# Altium footprint library SAMTEC SMD.PcbLib: 165 footprints (part 2 of 17)
Each footprint in its own frame and in the unit in brackets; x right, y up, seen from the top. Pads: shape width x height; smd on the part's side, far side on the other; paste and mask are expansions set on the pad; w line width, h text height; cw(c..) or ccw(c..) is an arc to the next point about the centre after c.
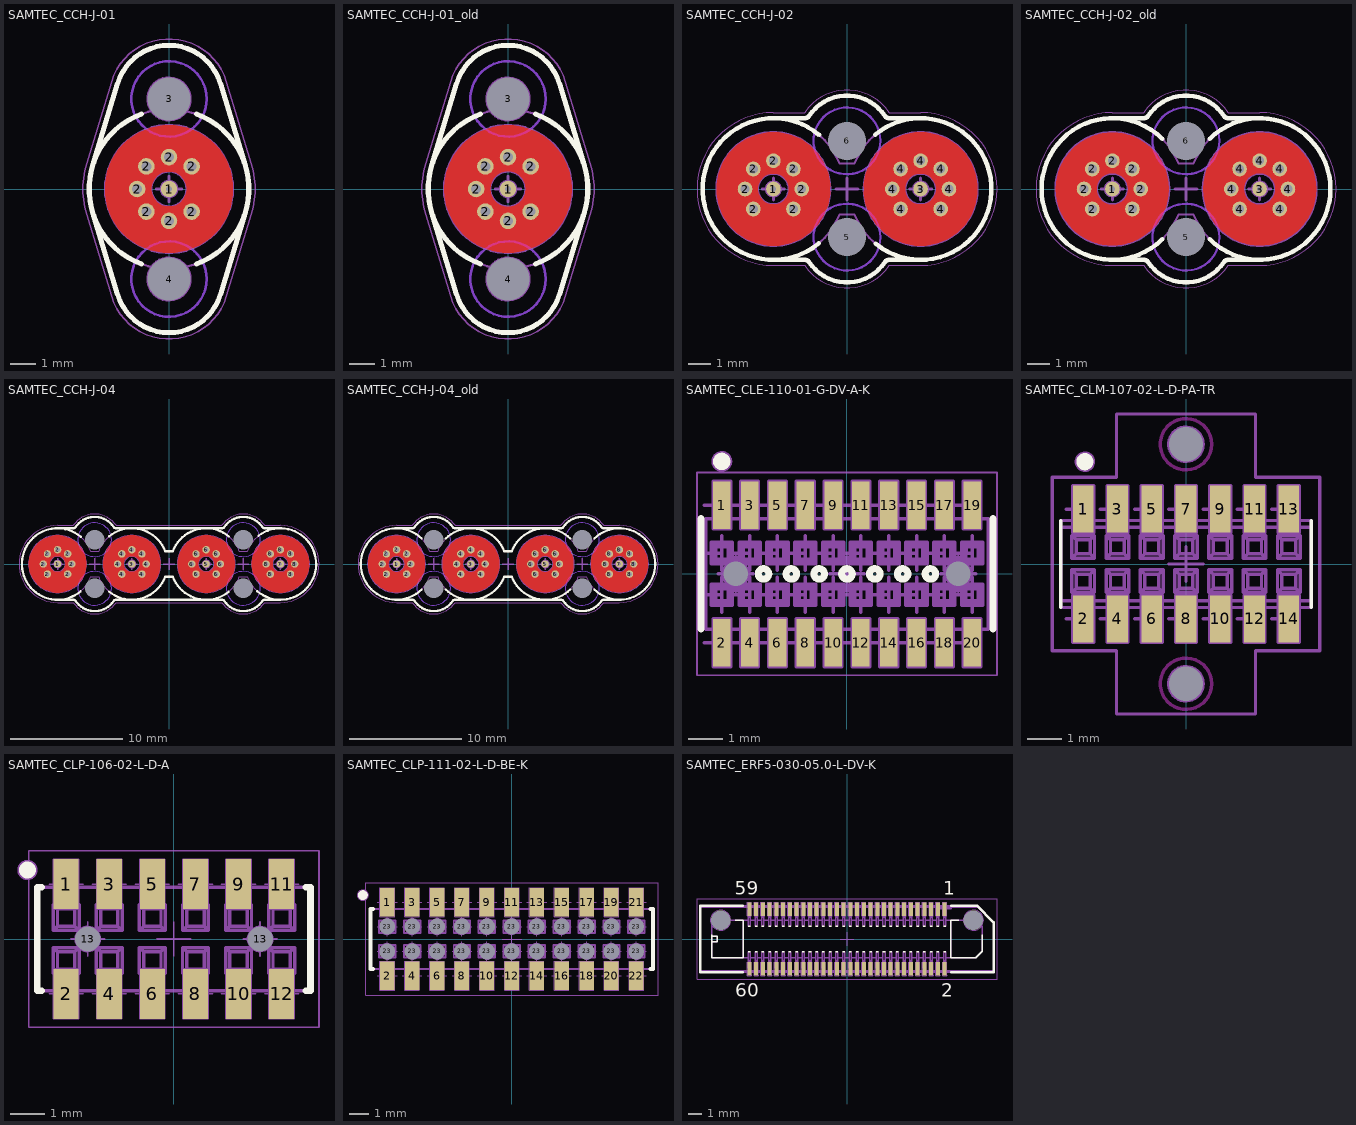
[diagram p1: the footprints below, top view; thin cyan lines are the x and y axes]

## SAMTEC_CCH-J-01 [mm] "CCH - Bull's Eye Low Cost High Performance SMA Test Point"
height 7.62
pads (10):
  round 0.66 hole 0.25: 1(0,0)
  round 0.66 hole 0.4 mask-0.2: 2(-1.27,0) 2(-0.898,-0.898) 2(-0.898,0.898) 2(0,-1.27) 2(0,1.27) 2(0.898,-0.898) 2(0.898,0.898)
  round 0.5 hole 1.7 unplated mask+0.6: 3(0,3.581) 4(0,-3.581)
Top Layer:
  region: -2.54,-0.05 -0.698,-0.05 -0.699,0.046 -0.66,0.233 -0.573,0.403 -0.442,0.542 -0.279,0.642 -0.095,0.693 0.095,0.693 0.279,0.642 0.442,0.542 0.573,0.403 0.66,0.233 0.699,0.046 0.698,-0.05 2.54,-0.05 2.544,0.203 2.454,0.702 2.267,1.173 1.991,1.597 1.636,1.959 1.217,2.244 0.75,2.44 0.253,2.54 -0.253,2.54 -0.75,2.44 -1.217,2.244 -1.636,1.959 -1.991,1.597 -2.267,1.173 -2.454,0.702 -2.544,0.203
  region: -2.54,0.05 -2.544,-0.203 -2.454,-0.702 -2.267,-1.173 -1.991,-1.597 -1.636,-1.959 -1.217,-2.244 -0.75,-2.44 -0.253,-2.54 0.253,-2.54 0.75,-2.44 1.217,-2.244 1.636,-1.959 1.991,-1.597 2.267,-1.173 2.454,-0.702 2.544,-0.203 2.54,0.05 0.698,0.05 0.699,-0.046 0.66,-0.233 0.573,-0.403 0.442,-0.542 0.279,-0.642 0.095,-0.693 -0.095,-0.693 -0.279,-0.642 -0.442,-0.542 -0.573,-0.403 -0.66,-0.233 -0.699,-0.046 -0.698,0.05
Bottom Layer keep-out:
  circle w0.1: c0,-3.581 r1.5
  circle w0.1: c0,3.581 r1.5
Top Overlay:
  lines w0.2: -1.096,-2.98 cw(c0,0) -1.096,2.98 ; 1.096,-2.98 ccw(c0,0) 1.096,2.98 ; 3.038,-0.923 2.041,-4.202 cw(c0,-3.581) -2.041,-4.202 -3.038,-0.923 cw(c0,0) -3.038,0.923 -2.041,4.202 cw(c0,3.581) 2.041,4.202 3.038,0.923
Bottom Solder:
  circle w0.33: c0.898,0.898 r0.165
  circle w0.33: c0,1.27 r0.165
  circle w0.33: c-0.898,0.898 r0.165
  circle w0.33: c-1.27,0 r0.165
  circle w0.33: c-0.898,-0.898 r0.165
  circle w0.33: c0,-1.27 r0.165
  circle w0.33: c0.898,-0.898 r0.165
Mechanical 8:
  circle w0.1: c0,0 r1.27
  circle w0.1: c-1.27,0 r0.205
  circle w0.1: c-1.27,0 r0.33
  circle w0.1: c-0.898,-0.898 r0.205
  circle w0.1: c-0.898,-0.898 r0.33
  circle w0.1: c-0.898,0.898 r0.205
  circle w0.1: c-0.898,0.898 r0.33
  circle w0.1: c0,-1.27 r0.205
  circle w0.1: c0,-1.27 r0.33
  circle w0.1: c0.898,-0.898 r0.205
  circle w0.1: c0.898,-0.898 r0.33
  circle w0.1: c0,1.27 r0.205
  circle w0.1: c0,1.27 r0.33
  circle w0.1: c0.898,0.898 r0.205
  circle w0.1: c0.898,0.898 r0.33
  circle w0.1: c0,0 r0.32
  circle w0.1: c0,0 r0.125
  circle w0.1: c0,0 r0.7
  circle w0.1: c0,-3.581 r0.85
  circle w0.1: c0,3.581 r0.85
  circle w0.1: c0,0 r2.54
  lines w0.1: -2.54,0 -1.62,0 -0.7,0 ; -1.415,-0.145 -1.27,0 -1.415,0.145 ; -1.103,-0.898 -0.898,-0.898 -0.898,-1.103 ; -1.103,0.898 -0.898,0.898 -0.898,1.103 ; -0.5,-3.581 0,-3.581 ; -0.5,0 0,0 ; -0.5,3.581 0,3.581 ; -0.145,-1.415 0,-1.27 0.145,-1.415 ; -0.145,1.415 0,1.27 0.145,1.415 ; 0,-4.081 0,-3.581 ; 0,-3.081 0,-3.581 ; 0,-0.5 0,0 ; 0,0.5 0,0 ; 0,3.081 0,3.581 ; 0,4.081 0,3.581 ; 0.5,-3.581 0,-3.581 ; 0.5,0 0,0 ; 0.5,3.581 0,3.581 ; 0.7,0 1.62,0 2.54,0 ; 0.898,-1.103 0.898,-0.898 1.103,-0.898 ; 0.898,1.103 0.898,0.898 1.103,0.898
Mechanical 14:
  circle w0.1: c0,0 r1.378
  circle w0.1: c0,0 r1.651
  circle w0.1: c0,0 r3.175
  lines w0.1: -0.54,-3.129 ccw(c0,-3.581) 0.54,-3.129 ; -0.54,3.129 cw(c0,3.581) 0.54,3.129 ; -3.038,-0.923 cw(c0,0) -3.038,0.923 -2.041,4.202 cw(c0,3.581) 2.041,4.202 3.038,0.923 cw(c0,0) 3.038,-0.923 2.041,-4.202 cw(c0,-3.581) -2.041,-4.202 -3.038,-0.923
Mechanical 15:
  lines w0.05: -3.277,-0.996 cw(c0,0) -3.277,0.996 -2.281,4.275 cw(c0,3.581) 2.281,4.275 3.277,0.996 cw(c0,0) 3.277,-0.996 2.281,-4.275 cw(c0,-3.581) -2.281,-4.275 -3.277,-0.996
Drill Drawing:
  lines w0.2: 1.651,0 0.8,0 ; 0.8,0 0.95,0.15 0.95,-0.15 0.8,0
  text "1 Filled hole" at 2.8,-5 h1
3D body "SAMTEC_CCH-J-01_Part2.stp": height 3.16, standoff -2.62, extent -1.395,-4.971 1.395,4.977
3D body "SAMTEC_CCH-J-01_Part1.stp": height 7.62, standoff 0, extent -3.175,-5.715 3.175,5.715

## SAMTEC_CCH-J-01_old [mm] "CCH - Bull's Eye Low Cost High Performance SMA Test Point"
height 7.62
pads (10):
  round 0.66 hole 0.25: 1(0,0)
  round 0.66 hole 0.4: 2(-1.27,0) 2(-0.898,-0.898) 2(-0.898,0.898) 2(0,-1.27) 2(0,1.27) 2(0.898,-0.898) 2(0.898,0.898)
  round 0.5 hole 1.7 unplated mask+0.6: 3(0,3.581) 4(0,-3.581)
Top Layer:
  circle w1.84: c0,0 r1.62
Bottom Layer keep-out:
  circle w0.1: c0,3.581 r1.5
  circle w0.1: c0,-3.581 r1.5
Top Overlay:
  lines w0.2: -1.096,-2.98 cw(c0,0) -1.096,2.98 ; 1.096,-2.98 ccw(c0,0) 1.096,2.98 ; 3.038,-0.923 2.041,-4.202 cw(c0,-3.581) -2.041,-4.202 -3.038,-0.923 cw(c0,0) -3.038,0.923 -2.041,4.202 cw(c0,3.581) 2.041,4.202 3.038,0.923
Mechanical 8:
  circle w0.1: c0,0 r2.54
  circle w0.1: c0,3.581 r0.85
  circle w0.1: c0,-3.581 r0.85
  circle w0.1: c0,0 r0.7
  circle w0.1: c0,0 r0.125
  circle w0.1: c0,0 r0.32
  circle w0.1: c0.898,0.898 r0.33
  circle w0.1: c0.898,0.898 r0.205
  circle w0.1: c0,1.27 r0.33
  circle w0.1: c0,1.27 r0.205
  circle w0.1: c0.898,-0.898 r0.33
  circle w0.1: c0.898,-0.898 r0.205
  circle w0.1: c0,-1.27 r0.33
  circle w0.1: c0,-1.27 r0.205
  circle w0.1: c-0.898,0.898 r0.33
  circle w0.1: c-0.898,0.898 r0.205
  circle w0.1: c-0.898,-0.898 r0.33
  circle w0.1: c-0.898,-0.898 r0.205
  circle w0.1: c-1.27,0 r0.33
  circle w0.1: c-1.27,0 r0.205
  circle w0.1: c0,0 r1.27
  lines w0.1: -2.54,0 -1.62,0 -0.7,0 ; -1.415,-0.145 -1.27,0 -1.415,0.145 ; -1.103,-0.898 -0.898,-0.898 -0.898,-1.103 ; -1.103,0.898 -0.898,0.898 -0.898,1.103 ; -0.5,-3.581 0,-3.581 ; -0.5,0 0,0 ; -0.5,3.581 0,3.581 ; -0.145,-1.415 0,-1.27 0.145,-1.415 ; -0.145,1.415 0,1.27 0.145,1.415 ; 0,-4.081 0,-3.581 ; 0,-3.081 0,-3.581 ; 0,-0.5 0,0 ; 0,0.5 0,0 ; 0,3.081 0,3.581 ; 0,4.081 0,3.581 ; 0.5,-3.581 0,-3.581 ; 0.5,0 0,0 ; 0.5,3.581 0,3.581 ; 0.7,0 1.62,0 2.54,0 ; 0.898,-1.103 0.898,-0.898 1.103,-0.898 ; 0.898,1.103 0.898,0.898 1.103,0.898
Mechanical 14:
  circle w0.1: c0,0 r3.175
  circle w0.1: c0,0 r1.651
  circle w0.1: c0,0 r1.378
  lines w0.1: -0.54,-3.129 ccw(c0,-3.581) 0.54,-3.129 ; -0.54,3.129 cw(c0,3.581) 0.54,3.129 ; -3.038,-0.923 cw(c0,0) -3.038,0.923 -2.041,4.202 cw(c0,3.581) 2.041,4.202 3.038,0.923 cw(c0,0) 3.038,-0.923 2.041,-4.202 cw(c0,-3.581) -2.041,-4.202 -3.038,-0.923
Mechanical 15:
  lines w0.05: -3.277,-0.996 cw(c0,0) -3.277,0.996 -2.281,4.275 cw(c0,3.581) 2.281,4.275 3.277,0.996 cw(c0,0) 3.277,-0.996 2.281,-4.275 cw(c0,-3.581) -2.281,-4.275 -3.277,-0.996
Drill Drawing:
  lines w0.2: 1.651,0 0.8,0 ; 0.8,0 0.95,-0.15 0.95,0.15 0.8,0
  text "1 Filled hole" at 2.8,-5 h1
3D body "SAMTEC_CCH-J-01_Part1.stp": height 7.62, standoff 0, extent -3.175,-5.715 3.175,5.715
3D body "SAMTEC_CCH-J-01_Part2.stp": height 3.16, standoff -2.62, extent -1.395,-4.971 1.395,4.977

## SAMTEC_CCH-J-02 [mm] "2 Positions CCH - Bull's Eye Low Cost High Performance SMA Test Point"
height 7.62
pads (18):
  round 0.66 hole 0.25: 1(-3.302,0) 3(3.302,0)
  round 0.66 hole 0.4 mask-0.2: 2(-4.572,0) 2(-4.2,-0.898) 2(-4.2,0.898) 2(-3.302,1.27) 2(-2.404,-0.898) 2(-2.404,0.898) 2(-2.032,0) 4(2.032,0) 4(2.404,-0.898) 4(2.404,0.898) 4(3.302,1.27) 4(4.2,-0.898) 4(4.2,0.898) 4(4.572,0)
  round 0.5 hole 1.7 unplated mask+0.6: 5(0,-2.159) 6(0,2.159)
Top Layer:
  region: 0.762,-0.05 2.604,-0.05 2.603,0.046 2.642,0.233 2.729,0.403 2.86,0.542 3.023,0.642 3.207,0.693 3.398,0.693 3.581,0.642 3.744,0.542 3.875,0.403 3.962,0.233 4.001,0.046 4,-0.05 5.842,-0.05 5.846,0.203 5.756,0.702 5.569,1.173 5.293,1.597 4.938,1.959 4.519,2.244 4.052,2.44 3.555,2.54 3.049,2.54 2.552,2.44 2.085,2.244 1.666,1.959 1.311,1.597 1.035,1.173 0.848,0.702 0.758,0.203
  region: 0.762,0.05 0.758,-0.203 0.848,-0.702 1.035,-1.173 1.311,-1.597 1.666,-1.959 2.085,-2.244 2.552,-2.44 3.049,-2.54 3.555,-2.54 4.052,-2.44 4.519,-2.244 4.938,-1.959 5.293,-1.597 5.569,-1.173 5.756,-0.702 5.846,-0.203 5.842,0.05 4,0.05 4.001,-0.046 3.962,-0.233 3.875,-0.403 3.744,-0.542 3.581,-0.642 3.398,-0.693 3.207,-0.693 3.023,-0.642 2.86,-0.542 2.729,-0.403 2.642,-0.233 2.603,-0.046 2.604,0.05
  region: -5.842,-0.05 -4,-0.05 -4.001,0.046 -3.962,0.233 -3.875,0.403 -3.744,0.542 -3.581,0.642 -3.398,0.693 -3.207,0.693 -3.023,0.642 -2.86,0.542 -2.729,0.403 -2.642,0.233 -2.603,0.046 -2.604,-0.05 -0.762,-0.05 -0.758,0.203 -0.848,0.702 -1.035,1.173 -1.311,1.597 -1.666,1.959 -2.085,2.244 -2.552,2.44 -3.049,2.54 -3.555,2.54 -4.052,2.44 -4.519,2.244 -4.938,1.959 -5.293,1.597 -5.569,1.173 -5.756,0.702 -5.846,0.203
  region: -5.842,0.05 -5.846,-0.203 -5.756,-0.702 -5.569,-1.173 -5.293,-1.597 -4.938,-1.959 -4.519,-2.244 -4.052,-2.44 -3.555,-2.54 -3.049,-2.54 -2.552,-2.44 -2.085,-2.244 -1.666,-1.959 -1.311,-1.597 -1.035,-1.173 -0.848,-0.702 -0.758,-0.203 -0.762,0.05 -2.604,0.05 -2.603,-0.046 -2.642,-0.233 -2.729,-0.403 -2.86,-0.542 -3.023,-0.642 -3.207,-0.693 -3.398,-0.693 -3.581,-0.642 -3.744,-0.542 -3.875,-0.403 -3.962,-0.233 -4.001,-0.046 -4,0.05
Bottom Layer keep-out:
  circle w0.1: c0,-2.159 r1.5
  circle w0.1: c0,2.159 r1.5
Top Overlay:
  lines w0.2: -3.302,-3.175 -1.901,-3.175 cw(c-1.901,-3.429) -1.69,-3.288 ccw(c0,-2.159) 1.69,-3.288 cw(c1.901,-3.429) 1.901,-3.175 3.302,-3.175 ; -3.302,3.175 -1.901,3.175 ccw(c-1.901,3.429) -1.69,3.288 cw(c0,2.159) 1.69,3.288 ccw(c1.901,3.429) 1.901,3.175 3.302,3.175 ; -1.259,-2.43 cw(c-3.302,0) -1.25,2.423 ; 1.261,2.432 cw(c3.302,0) 1.295,-2.46
Bottom Solder:
  circle w0.33: c4.2,-0.898 r0.165
  circle w0.33: c4.572,0 r0.165
  circle w0.33: c4.2,0.898 r0.165
  circle w0.33: c3.302,1.27 r0.165
  circle w0.33: c2.404,0.898 r0.165
  circle w0.33: c2.032,0 r0.165
  circle w0.33: c2.404,-0.898 r0.165
  circle w0.33: c-2.404,-0.898 r0.165
  circle w0.33: c-2.032,0 r0.165
  circle w0.33: c-2.404,0.898 r0.165
  circle w0.33: c-3.302,1.27 r0.165
  circle w0.33: c-4.2,0.898 r0.165
  circle w0.33: c-4.572,0 r0.165
  circle w0.33: c-4.2,-0.898 r0.165
Mechanical 8:
  circle w0.127: c-3.302,0 r1.27
  circle w0.127: c-3.302,1.27 r0.205
  circle w0.127: c-3.302,1.27 r0.33
  circle w0.127: c-4.2,0.898 r0.205
  circle w0.127: c-4.2,0.898 r0.33
  circle w0.127: c-2.404,0.898 r0.205
  circle w0.127: c-2.404,0.898 r0.33
  circle w0.127: c-4.572,0 r0.205
  circle w0.127: c-4.572,0 r0.33
  circle w0.127: c-4.2,-0.898 r0.205
  circle w0.127: c-4.2,-0.898 r0.33
  circle w0.127: c-2.032,0 r0.205
  circle w0.127: c-2.032,0 r0.33
  circle w0.127: c-2.404,-0.898 r0.205
  circle w0.127: c-2.404,-0.898 r0.33
  circle w0.127: c-3.302,0 r0.32
  circle w0.127: c-3.302,0 r0.125
  circle w0.127: c-3.302,0 r0.7
  circle w0.127: c-3.302,0 r2.54
  circle w0.127: c-3.302,0 r1.62
  circle w0.127: c3.302,0 r1.27
  circle w0.127: c3.302,1.27 r0.205
  circle w0.127: c3.302,1.27 r0.33
  circle w0.127: c2.404,0.898 r0.205
  circle w0.127: c2.404,0.898 r0.33
  circle w0.127: c4.2,0.898 r0.205
  circle w0.127: c4.2,0.898 r0.33
  circle w0.127: c2.032,0 r0.205
  circle w0.127: c2.032,0 r0.33
  circle w0.127: c2.404,-0.898 r0.205
  circle w0.127: c2.404,-0.898 r0.33
  circle w0.127: c4.572,0 r0.205
  circle w0.127: c4.572,0 r0.33
  circle w0.127: c4.2,-0.898 r0.205
  circle w0.127: c4.2,-0.898 r0.33
  circle w0.127: c3.302,0 r0.32
  circle w0.127: c3.302,0 r0.125
  circle w0.127: c3.302,0 r0.7
  circle w0.127: c3.302,0 r2.54
  circle w0.127: c3.302,0 r1.62
  lines w0.127: -4.717,-0.145 -4.572,0 -4.717,0.145 ; -4.405,-0.898 -4.2,-0.898 -4.2,-1.103 ; -4.405,0.898 -4.2,0.898 -4.2,1.103 ; -3.447,1.415 -3.302,1.27 -3.157,1.415 ; -3.302,2.54 -3.302,1.62 ; -2.404,-1.103 -2.404,-0.898 -2.199,-0.898 ; -2.404,1.103 -2.404,0.898 -2.199,0.898 ; -1.887,-0.145 -2.032,0 -1.887,0.145 ; -1.682,0 -0.762,0 ; -0.5,-2.159 0,-2.159 ; -0.5,2.159 0,2.159 ; 0,-2.659 0,-2.159 ; 0,-1.659 0,-2.159 ; 0,-0.5 0,0 ; 0,0.5 0,0 ; 0,1.659 0,2.159 ; 0,2.659 0,2.159 ; 0.5,-2.159 0,-2.159 ; 0.5,2.159 0,2.159 ; 1.887,-0.145 2.032,0 1.887,0.145 ; 2.199,-0.898 2.404,-0.898 2.404,-1.103 ; 2.199,0.898 2.404,0.898 2.404,1.103 ; 3.157,1.415 3.302,1.27 3.447,1.415 ; 3.302,2.54 3.302,1.62 ; 4.2,-1.103 4.2,-0.898 4.405,-0.898 ; 4.2,1.103 4.2,0.898 4.405,0.898 ; 4.717,-0.145 4.572,0 4.717,0.145 ; 4.922,0 5.842,0 ; -3.302,0 -3.302,-0.5 -3.302,0 ; -3.302,0 -3.802,0 -3.302,0 ; -3.302,0 -3.302,0.5 -3.302,0 ; -3.302,0 -2.802,0 -3.302,0 ; -3.302,1.62 -3.302,0.7 -3.302,1.62 ; 0,0 -0.5,0 0,0 ; 0,0 0.5,0 0,0 ; 3.302,0 3.302,-0.5 3.302,0 ; 3.302,0 2.802,0 3.302,0 ; 3.302,0 3.302,0.5 3.302,0 ; 3.302,0 3.802,0 3.302,0 ; 3.302,1.62 3.302,0.7 3.302,1.62
Mechanical 14:
  circle w0.1: c-3.302,0 r1.378
  circle w0.1: c-3.302,0 r1.651
  circle w0.1: c3.302,0 r1.378
  circle w0.1: c3.302,0 r1.651
  circle w0.1: c0,2.159 r0.679
  circle w0.1: c0,-2.159 r0.679
  lines w0.1: -4.225,-3.038 ccw(c-3.302,0) -2.379,-3.038 ; -4.225,3.038 cw(c-3.302,0) -2.379,3.038 ; -3.302,-3.175 -1.901,-3.175 cw(c-1.901,-3.429) -1.69,-3.288 ccw(c0,-2.159) 1.69,-3.288 cw(c1.901,-3.429) 1.901,-3.175 3.302,-3.175 ; -3.302,3.175 -1.901,3.175 ccw(c-1.901,3.429) -1.69,3.288 cw(c0,2.159) 1.69,3.288 ccw(c1.901,3.429) 1.901,3.175 3.302,3.175 ; 2.379,-3.038 ccw(c3.302,0) 4.225,-3.038 ; 2.379,3.038 cw(c3.302,0) 4.225,3.038 ; -0.34,-1.143 cw(c-3.302,0) -0.34,1.143 0.34,1.143 cw(c3.302,0) 0.34,-1.143 -0.34,-1.143
Mechanical 15:
  lines w0.05: -1.901,-3.425 -3.302,-3.425 cw(c-3.302,0) -3.302,3.425 -1.901,3.425 ; -1.897,-3.427 ccw(c0,-2.159) 1.897,-3.427 ; -1.897,3.427 cw(c0,2.159) 1.897,3.427 ; 1.901,-3.425 3.302,-3.425 ccw(c3.302,0) 3.302,3.425 1.901,3.425
Drill Drawing:
  lines w0.1: -3.302,2.9 -3.302,0.8 ; 3.302,2.9 3.302,0.8 ; -3.302,0.8 -3.152,0.95 -3.452,0.95 -3.302,0.8 ; 3.302,0.8 3.452,0.95 3.152,0.95 3.302,0.8
  text "2 Filled holes" at -6.5,3.3 h1
3D body "SAMTEC_CCH-J-02_Part1.stp": height 7.62, standoff 0, extent -6.477,-4.171 6.477,4.171
3D body "SAMTEC_CCH-J-02_Part2.stp": height 3.16, standoff -2.62, extent -1.395,-3.55 1.395,3.554

## SAMTEC_CCH-J-02_old [mm] "2 Positions CCH - Bull's Eye Low Cost High Performance SMA Test Point"
height 7.62
pads (18):
  round 0.66 hole 0.25: 1(-3.302,0) 3(3.302,0)
  round 0.66 hole 0.4: 2(-4.572,0) 2(-4.2,-0.898) 2(-4.2,0.898) 2(-3.302,1.27) 2(-2.404,-0.898) 2(-2.404,0.898) 2(-2.032,0) 4(2.032,0) 4(2.404,-0.898) 4(2.404,0.898) 4(3.302,1.27) 4(4.2,-0.898) 4(4.2,0.898) 4(4.572,0)
  round 0.5 hole 1.7 unplated mask+0.6: 5(0,-2.159) 6(0,2.159)
Top Layer:
  circle w1.84: c-3.302,0 r1.62
  circle w1.84: c3.302,0 r1.62
Bottom Layer keep-out:
  circle w0.1: c0,-2.159 r1.5
  circle w0.1: c0,2.159 r1.5
Top Overlay:
  lines w0.2: -4.225,-3.038 ccw(c-3.302,0) -2.379,-3.038 ; -4.225,3.038 cw(c-3.302,0) -2.379,3.038 ; -3.302,-3.175 -1.901,-3.175 cw(c-1.901,-3.429) -1.69,-3.288 ccw(c0,-2.159) 1.69,-3.288 cw(c1.901,-3.429) 1.901,-3.175 3.302,-3.175 ; -3.302,3.175 -1.901,3.175 ccw(c-1.901,3.429) -1.69,3.288 cw(c0,2.159) 1.69,3.288 ccw(c1.901,3.429) 1.901,3.175 3.302,3.175 ; -1.074,-2.262 cw(c-3.302,0) -1.074,2.262 ; 1.074,-2.262 ccw(c3.302,0) 1.074,2.262 ; 2.379,-3.038 ccw(c3.302,0) 4.225,-3.038 ; 2.379,3.038 cw(c3.302,0) 4.225,3.038
Mechanical 8:
  circle w0.127: c-3.302,0 r1.27
  circle w0.127: c-3.302,1.27 r0.205
  circle w0.127: c-3.302,1.27 r0.33
  circle w0.127: c-4.2,0.898 r0.205
  circle w0.127: c-4.2,0.898 r0.33
  circle w0.127: c-2.404,0.898 r0.205
  circle w0.127: c-2.404,0.898 r0.33
  circle w0.127: c-4.572,0 r0.205
  circle w0.127: c-4.572,0 r0.33
  circle w0.127: c-4.2,-0.898 r0.205
  circle w0.127: c-4.2,-0.898 r0.33
  circle w0.127: c-2.032,0 r0.205
  circle w0.127: c-2.032,0 r0.33
  circle w0.127: c-2.404,-0.898 r0.205
  circle w0.127: c-2.404,-0.898 r0.33
  circle w0.127: c-3.302,0 r0.32
  circle w0.127: c-3.302,0 r0.125
  circle w0.127: c-3.302,0 r0.7
  circle w0.127: c-3.302,0 r2.54
  circle w0.127: c-3.302,0 r1.62
  circle w0.127: c3.302,0 r1.27
  circle w0.127: c3.302,1.27 r0.205
  circle w0.127: c3.302,1.27 r0.33
  circle w0.127: c2.404,0.898 r0.205
  circle w0.127: c2.404,0.898 r0.33
  circle w0.127: c4.2,0.898 r0.205
  circle w0.127: c4.2,0.898 r0.33
  circle w0.127: c2.032,0 r0.205
  circle w0.127: c2.032,0 r0.33
  circle w0.127: c2.404,-0.898 r0.205
  circle w0.127: c2.404,-0.898 r0.33
  circle w0.127: c4.572,0 r0.205
  circle w0.127: c4.572,0 r0.33
  circle w0.127: c4.2,-0.898 r0.205
  circle w0.127: c4.2,-0.898 r0.33
  circle w0.127: c3.302,0 r0.32
  circle w0.127: c3.302,0 r0.125
  circle w0.127: c3.302,0 r0.7
  circle w0.127: c3.302,0 r2.54
  circle w0.127: c3.302,0 r1.62
  lines w0.127: -4.717,-0.145 -4.572,0 -4.717,0.145 ; -4.405,-0.898 -4.2,-0.898 -4.2,-1.103 ; -4.405,0.898 -4.2,0.898 -4.2,1.103 ; -3.447,1.415 -3.302,1.27 -3.157,1.415 ; -3.302,2.54 -3.302,1.62 ; -2.404,-1.103 -2.404,-0.898 -2.199,-0.898 ; -2.404,1.103 -2.404,0.898 -2.199,0.898 ; -1.887,-0.145 -2.032,0 -1.887,0.145 ; -1.682,0 -0.762,0 ; -0.5,-2.159 0,-2.159 ; -0.5,2.159 0,2.159 ; 0,-2.659 0,-2.159 ; 0,-1.659 0,-2.159 ; 0,-0.5 0,0 ; 0,0.5 0,0 ; 0,1.659 0,2.159 ; 0,2.659 0,2.159 ; 0.5,-2.159 0,-2.159 ; 0.5,2.159 0,2.159 ; 1.887,-0.145 2.032,0 1.887,0.145 ; 2.199,-0.898 2.404,-0.898 2.404,-1.103 ; 2.199,0.898 2.404,0.898 2.404,1.103 ; 3.157,1.415 3.302,1.27 3.447,1.415 ; 3.302,2.54 3.302,1.62 ; 4.2,-1.103 4.2,-0.898 4.405,-0.898 ; 4.2,1.103 4.2,0.898 4.405,0.898 ; 4.717,-0.145 4.572,0 4.717,0.145 ; 4.922,0 5.842,0 ; -3.302,0 -3.302,-0.5 -3.302,0 ; -3.302,0 -3.802,0 -3.302,0 ; -3.302,0 -3.302,0.5 -3.302,0 ; -3.302,0 -2.802,0 -3.302,0 ; -3.302,1.62 -3.302,0.7 -3.302,1.62 ; 0,0 -0.5,0 0,0 ; 0,0 0.5,0 0,0 ; 3.302,0 3.302,-0.5 3.302,0 ; 3.302,0 2.802,0 3.302,0 ; 3.302,0 3.302,0.5 3.302,0 ; 3.302,0 3.802,0 3.302,0 ; 3.302,1.62 3.302,0.7 3.302,1.62
Mechanical 14:
  circle w0.1: c-3.302,0 r1.378
  circle w0.1: c-3.302,0 r1.651
  circle w0.1: c3.302,0 r1.378
  circle w0.1: c3.302,0 r1.651
  circle w0.1: c0,2.159 r0.679
  circle w0.1: c0,-2.159 r0.679
  lines w0.1: -4.225,-3.038 ccw(c-3.302,0) -2.379,-3.038 ; -4.225,3.038 cw(c-3.302,0) -2.379,3.038 ; -3.302,-3.175 -1.901,-3.175 cw(c-1.901,-3.429) -1.69,-3.288 ccw(c0,-2.159) 1.69,-3.288 cw(c1.901,-3.429) 1.901,-3.175 3.302,-3.175 ; -3.302,3.175 -1.901,3.175 ccw(c-1.901,3.429) -1.69,3.288 cw(c0,2.159) 1.69,3.288 ccw(c1.901,3.429) 1.901,3.175 3.302,3.175 ; 2.379,-3.038 ccw(c3.302,0) 4.225,-3.038 ; 2.379,3.038 cw(c3.302,0) 4.225,3.038 ; -0.34,-1.143 cw(c-3.302,0) -0.34,1.143 0.34,1.143 cw(c3.302,0) 0.34,-1.143 -0.34,-1.143
Mechanical 15:
  lines w0.05: -1.901,-3.425 -3.302,-3.425 cw(c-3.302,0) -3.302,3.425 -1.901,3.425 ; -1.897,-3.427 ccw(c0,-2.159) 1.897,-3.427 ; -1.897,3.427 cw(c0,2.159) 1.897,3.427 ; 1.901,-3.425 3.302,-3.425 ccw(c3.302,0) 3.302,3.425 1.901,3.425
Drill Drawing:
  lines w0.1: -3.302,2.9 -3.302,0.8 ; 3.302,2.9 3.302,0.8 ; -3.302,0.8 -3.152,0.95 -3.452,0.95 -3.302,0.8 ; 3.302,0.8 3.452,0.95 3.152,0.95 3.302,0.8
  text "2 Filled holes" at -6.5,3.3 h1
3D body "SAMTEC_CCH-J-02_Part1.stp": height 7.62, standoff 0, extent -6.477,-4.171 6.477,4.171
3D body "SAMTEC_CCH-J-02_Part2.stp": height 3.16, standoff -2.62, extent -1.395,-3.55 1.395,3.554
